# Altium footprint library ICs_rus.PCBLIB: 103 footprints (part 1 of 7)
Each footprint in its own frame and in the unit in brackets; x right, y up, seen from the top. Pads: shape width x height; smd on the part's side, far side on the other; paste and mask are expansions set on the pad; w line width, h text height; cw(c..) or ccw(c..) is an arc to the next point about the centre after c.
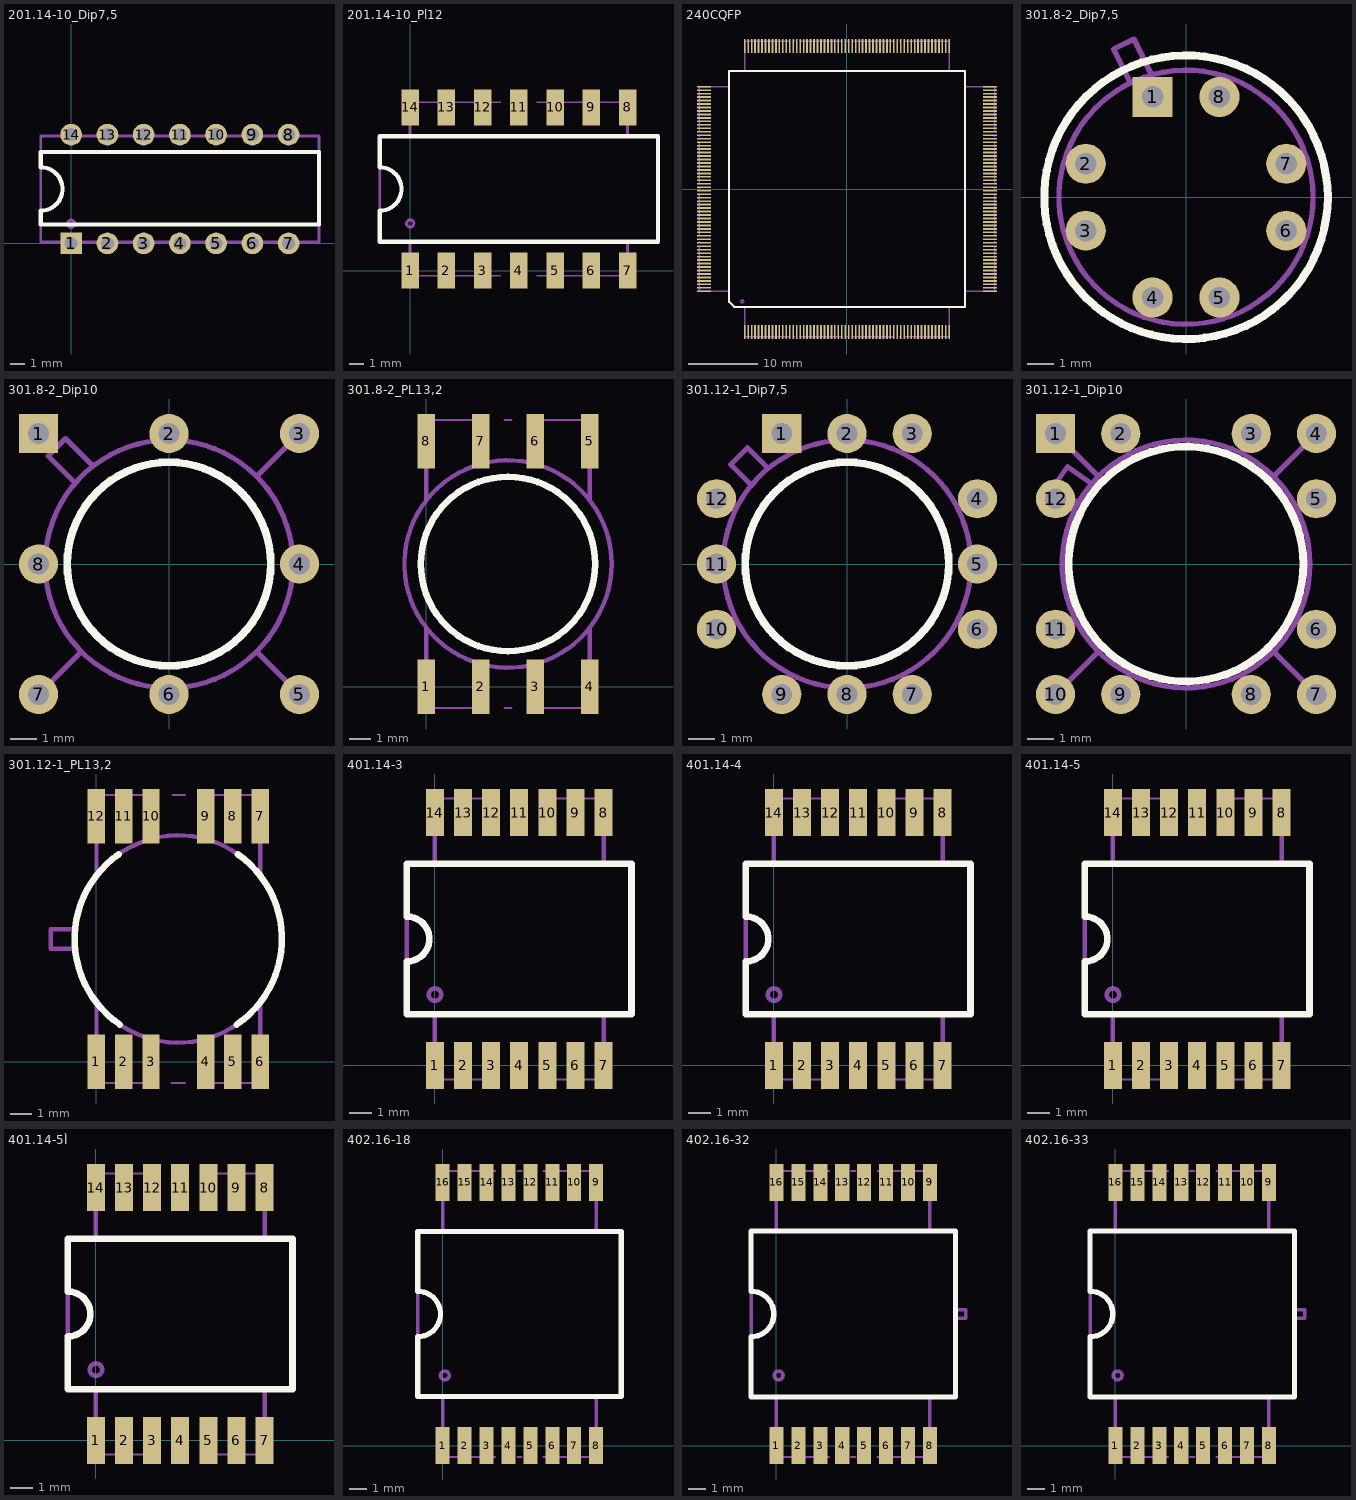
[diagram p0: the footprints below, top view; thin cyan lines are the x and y axes]

## 201.14-10_Dip7,5 [mm]
pads (14):
  rect 1.5x1.5 hole 0.9: 1(0,0)
  round 1.5 hole 0.9: 2(2.5,0) 3(5,0) 4(7.5,0) 5(10,0) 6(12.5,0) 7(15,0) 8(15,7.5) 9(12.5,7.5) 10(10,7.5) 11(7.5,7.5) 12(5,7.5) 13(2.5,7.5) 14(0,7.5)
Top Overlay:
  lines w0.3: -2.1,1.3 -2.1,2.25 ccw(c-2.1,3.75) -2.1,5.25 -2.1,6.3 17.1,6.3 17.1,1.3 -2.1,1.3
Mechanical 1:
  circle w0.2: c0,1.35 r0.251
  lines w0.2: -2.1,0.1 -2.1,7.4 17.1,7.4 17.1,0.1 -2.1,0.1
  text ".Comment" at 4.4,2.7 h1.5
  text ".Designator" at 6.3,4.8 h1.5
  text "14" at -0.5,5.5 h1.5
3D body: height 4.5, standoff -3, extent -2.2,-0.1 17,7.7

## 201.14-10_Pl12 [mm]
pads (14):
  rect 1.2x2.5 smd: 1(0,0) 2(2.5,0) 3(5,0) 4(7.5,0) 5(10,0) 6(12.5,0) 7(15,0) 8(15,11.25) 9(12.5,11.25) 10(10,11.25) 11(7.5,11.25) 12(5,11.25) 13(2.5,11.25) 14(0,11.25)
Top Overlay:
  lines w0.3: -2.1,1.975 -2.1,4.125 ccw(c-2.1,5.625) -2.1,7.125 -2.1,9.275 17.1,9.275 17.1,1.975 -2.1,1.975
Mechanical 1:
  circle w0.2: c0,3.25 r0.251
  lines w0.1: 0,-0.375 6.25,-0.375 ; 0,11.625 6.25,11.625 ; 7,-0.375 8,-0.375 ; 7,11.625 8,11.625 ; 8.75,-0.375 15,-0.375 ; 8.75,11.625 15,11.625
  lines w0.2: 0,-0.375 0,1.975 ; 0,9.275 0,11.625 ; 15,-0.375 15,1.975 ; 15,9.275 15,11.625 ; -2.1,1.975 -2.1,9.275 17.1,9.275 17.1,1.975 -2.1,1.975
  text "14" at 0.7,10.1 h1.5
  text ".Comment" at 4.5,4.3 h1.5
  text ".Designator" at 6.4,6.4 h1.5
3D body: height 4.5, standoff 0, extent -2.3,-0.4 16.9,11.6

## 240CQFP [mm]
pads (240):
  rect 0.25x2 smd: 1(-14.75,-20.625) 2(-14.25,-20.625) 3(-13.75,-20.625) 4(-13.25,-20.625) 5(-12.75,-20.625) 6(-12.25,-20.625) 7(-11.75,-20.625) 8(-11.25,-20.625) 9(-10.75,-20.625) 10(-10.25,-20.625) 11(-9.75,-20.625) 12(-9.25,-20.625) 13(-8.75,-20.625) 14(-8.25,-20.625) 15(-7.75,-20.625) 16(-7.25,-20.625) 17(-6.75,-20.625) 18(-6.25,-20.625) 19(-5.75,-20.625) 20(-5.25,-20.625) 21(-4.75,-20.625) 22(-4.25,-20.625) 23(-3.75,-20.625) 24(-3.25,-20.625) 25(-2.75,-20.625) 26(-2.25,-20.625) 27(-1.75,-20.625) 28(-1.25,-20.625) 29(-0.75,-20.625) 30(-0.25,-20.625) 31(0.25,-20.625) 32(0.75,-20.625) 33(1.25,-20.625) 34(1.75,-20.625) 35(2.25,-20.625) 36(2.75,-20.625) 37(3.25,-20.625) 38(3.75,-20.625) 39(4.25,-20.625) 40(4.75,-20.625) 41(5.25,-20.625) 42(5.75,-20.625) 43(6.25,-20.625) 44(6.75,-20.625) 45(7.25,-20.625) 46(7.75,-20.625) 47(8.25,-20.625) 48(8.75,-20.625) 49(9.25,-20.625) 50(9.75,-20.625) 51(10.25,-20.625) 52(10.75,-20.625) 53(11.25,-20.625) 54(11.75,-20.625) 55(12.25,-20.625) 56(12.75,-20.625) 57(13.25,-20.625) 58(13.75,-20.625) 59(14.25,-20.625) 60(14.75,-20.625) 121(14.75,20.625) 122(14.25,20.625) 123(13.75,20.625) 124(13.25,20.625) 125(12.75,20.625) 126(12.25,20.625) 127(11.75,20.625) 128(11.25,20.625) 129(10.75,20.625) 130(10.25,20.625) 131(9.75,20.625) 132(9.25,20.625) 133(8.75,20.625) 134(8.25,20.625) 135(7.75,20.625) 136(7.25,20.625) 137(6.75,20.625) 138(6.25,20.625) 139(5.75,20.625) 140(5.25,20.625) 141(4.75,20.625) 142(4.25,20.625) 143(3.75,20.625) 144(3.25,20.625) 145(2.75,20.625) 146(2.25,20.625) 147(1.75,20.625) 148(1.25,20.625) 149(0.75,20.625) 150(0.25,20.625) 151(-0.25,20.625) 152(-0.75,20.625) 153(-1.25,20.625) 154(-1.75,20.625) 155(-2.25,20.625) 156(-2.75,20.625) 157(-3.25,20.625) 158(-3.75,20.625) 159(-4.25,20.625) 160(-4.75,20.625) 161(-5.25,20.625) 162(-5.75,20.625) 163(-6.25,20.625) 164(-6.75,20.625) 165(-7.25,20.625) 166(-7.75,20.625) 167(-8.25,20.625) 168(-8.75,20.625) 169(-9.25,20.625) 170(-9.75,20.625) 171(-10.25,20.625) 172(-10.75,20.625) 173(-11.25,20.625) 174(-11.75,20.625) 175(-12.25,20.625) 176(-12.75,20.625) 177(-13.25,20.625) 178(-13.75,20.625) 179(-14.25,20.625) 180(-14.75,20.625)
  rect 2x0.25 smd: 61(20.625,-14.75) 62(20.625,-14.25) 63(20.625,-13.75) 64(20.625,-13.25) 65(20.625,-12.75) 66(20.625,-12.25) 67(20.625,-11.75) 68(20.625,-11.25) 69(20.625,-10.75) 70(20.625,-10.25) 71(20.625,-9.75) 72(20.625,-9.25) 73(20.625,-8.75) 74(20.625,-8.25) 75(20.625,-7.75) 76(20.625,-7.25) 77(20.625,-6.75) 78(20.625,-6.25) 79(20.625,-5.75) 80(20.625,-5.25) 81(20.625,-4.75) 82(20.625,-4.25) 83(20.625,-3.75) 84(20.625,-3.25) 85(20.625,-2.75) 86(20.625,-2.25) 87(20.625,-1.75) 88(20.625,-1.25) 89(20.625,-0.75) 90(20.625,-0.25) 91(20.625,0.25) 92(20.625,0.75) 93(20.625,1.25) 94(20.625,1.75) 95(20.625,2.25) 96(20.625,2.75) 97(20.625,3.25) 98(20.625,3.75) 99(20.625,4.25) 100(20.625,4.75) 101(20.625,5.25) 102(20.625,5.75) 103(20.625,6.25) 104(20.625,6.75) 105(20.625,7.25) 106(20.625,7.75) 107(20.625,8.25) 108(20.625,8.75) 109(20.625,9.25) 110(20.625,9.75) 111(20.625,10.25) 112(20.625,10.75) 113(20.625,11.25) 114(20.625,11.75) 115(20.625,12.25) 116(20.625,12.75) 117(20.625,13.25) 118(20.625,13.75) 119(20.625,14.25) 120(20.625,14.75) 181(-20.625,14.75) 182(-20.625,14.25) 183(-20.625,13.75) 184(-20.625,13.25) 185(-20.625,12.75) 186(-20.625,12.25) 187(-20.625,11.75) 188(-20.625,11.25) 189(-20.625,10.75) 190(-20.625,10.25) 191(-20.625,9.75) 192(-20.625,9.25) 193(-20.625,8.75) 194(-20.625,8.25) 195(-20.625,7.75) 196(-20.625,7.25) 197(-20.625,6.75) 198(-20.625,6.25) 199(-20.625,5.75) 200(-20.625,5.25) 201(-20.625,4.75) 202(-20.625,4.25) 203(-20.625,3.75) 204(-20.625,3.25) 205(-20.625,2.75) 206(-20.625,2.25) 207(-20.625,1.75) 208(-20.625,1.25) 209(-20.625,0.75) 210(-20.625,0.25) 211(-20.625,-0.25) 212(-20.625,-0.75) 213(-20.625,-1.25) 214(-20.625,-1.75) 215(-20.625,-2.25) 216(-20.625,-2.75) 217(-20.625,-3.25) 218(-20.625,-3.75) 219(-20.625,-4.25) 220(-20.625,-4.75) 221(-20.625,-5.25) 222(-20.625,-5.75) 223(-20.625,-6.25) 224(-20.625,-6.75) 225(-20.625,-7.25) 226(-20.625,-7.75) 227(-20.625,-8.25) 228(-20.625,-8.75) 229(-20.625,-9.25) 230(-20.625,-9.75) 231(-20.625,-10.25) 232(-20.625,-10.75) 233(-20.625,-11.25) 234(-20.625,-11.75) 235(-20.625,-12.25) 236(-20.625,-12.75) 237(-20.625,-13.25) 238(-20.625,-13.75) 239(-20.625,-14.25) 240(-20.625,-14.75)
Top Overlay:
  lines w0.3: -17,-16.25 -16.25,-17 17,-17 17,17 -17,17 -17,-16.25
Mechanical 1:
  lines w0.2: -21.31,-14.755 -21.301,-8.3 ; -21.301,8.3 -21.31,14.755 -17,14.75 ; -21.3,-7.6 -21.3,-7.5 ; -21.3,-6.8 -21.3,-0.7 ; -21.3,-0.1 -21.3,0.1 ; -21.3,0.7 -21.3,6.8 ; -21.3,7.5 -21.3,7.6 ; -21.25,-14.75 -17,-14.75 ; -14.755,-21.31 -8.3,-21.301 ; -14.755,17 -14.755,21.31 -8.3,21.301 ; -14.75,-21.31 -14.75,-17 ; -7.6,-21.3 -7.5,-21.3 ; -7.6,21.3 -7.5,21.3 ; -6.8,-21.3 -0.7,-21.3 ; -6.8,21.3 -0.7,21.3 ; -0.1,-21.3 0.1,-21.3 ; -0.1,21.3 0.1,21.3 ; 0.7,-21.3 6.8,-21.3 ; 0.7,21.3 6.8,21.3 ; 7.5,-21.3 7.6,-21.3 ; 7.5,21.3 7.6,21.3 ; 8.3,-21.301 14.755,-21.31 ; 8.3,21.301 14.755,21.31 ; 14.75,-21.31 14.75,-17 ; 14.75,17 14.75,21.31 ; 17,-14.75 21.31,-14.755 21.301,-8.3 ; 17,14.75 21.31,14.745 ; 21.3,-7.6 21.3,-7.5 ; 21.3,-6.8 21.3,-0.7 ; 21.3,-0.1 21.3,0.1 ; 21.3,0.7 21.3,6.8 ; 21.3,7.5 21.3,7.6 ; 21.301,8.3 21.31,14.755 ; -17,-16.25 -16.25,-17 17,-17 17,17 -17,17 -17,-16.25 ; -14.9,-16.2 ccw(c-15.1,-16.2) -14.9,-16.2
  text ".Designator" at -1.43,0.905 h1.5
  text ".Comment" at -3.02,-0.795 h1.5
  text "240" at -16.3,-14.7 h1.5

## 301.8-2_Dip7,5 [mm]
pads (8):
  rect 1.5x1.5 hole 0.8 unplated: 1(-1.25,3.75)
  round 1.5 hole 0.8 unplated: 2(-3.75,1.25) 3(-3.75,-1.25) 4(-1.25,-3.75) 5(1.25,-3.75) 6(3.75,-1.25) 7(3.75,1.25) 8(1.25,3.75)
Top Overlay:
  circle w0.3: c0,0 r5.3
Mechanical 1:
  circle w0.2: c0,0 r4.75
  lines w0.2: -2.08,4.275 -2.705,5.54 -1.945,5.915 -1.29,4.57
  text ".Designator" at -1,0 h1.5
  text ".Comment" at -2.9,-2.1 h1.5
  text "8" at 1,2.9 h1.5
3D body: height 8.5, standoff -3, extent -4.7,-4.7 4.69,5.185

## 301.8-2_Dip10 [mm]
pads (8):
  rect 1.5x1.5 hole 0.8 unplated: 1(-5,5)
  round 1.5 hole 0.8 unplated: 2(0,5) 3(5,5) 4(5,0) 5(5,-5) 6(0,-5) 7(-5,-5) 8(-5,0)
Top Layer:
  lines w0.2: -5,5 -4.4,4.4 -5,5
Top Overlay:
  circle w0.3: c0,0 r3.9
Mechanical 1:
  circle w0.2: c0,0 r4.75
  lines w0.2: -5,-5 -3.375,-3.375 ; -5,0 -4.75,0 ; -5,5 -4.4,4.4 ; -3.595,3.1 -4.63,4.145 -3.97,4.805 -2.91,3.755 ; 0,-5 0,-4.75 ; 0,4.75 0,5 ; 3.375,-3.375 5,-5 ; 3.375,3.375 5,5 ; 4.75,0 5,0
  text ".Comment" at -2.7,-1.4 h1.5
  text ".Designator" at -0.8,0.7 h1.5
  text "8" at -3.7,-0.3 h1.5
3D body: height 8.5, standoff -3, extent -5.2,-5.3 5.3,5.2

## 301.8-2_PL13,2 [mm]
pads (8):
  rect 0.8x2.5 smd: 1(0,0) 2(2.5,0) 3(5,0) 4(7.5,0) 5(7.5,11.25) 6(5,11.25) 7(2.5,11.25) 8(0,11.25)
Top Overlay:
  circle w0.3: c3.75,5.625 r4
Mechanical 1:
  circle w0.2: c3.75,5.625 r4.75
  lines w0.1: 0,-0.975 2.5,-0.975 ; 0,12.225 2.5,12.225 ; 3.6,-0.975 3.9,-0.975 ; 3.6,12.225 3.9,12.225 ; 5,-0.975 7.5,-0.975 ; 5,12.225 7.5,12.225
  lines w0.2: 0,-0.975 0,2.7 ; 0,8.55 0,12.225 ; 7.5,-0.975 7.5,2.7 ; 7.5,8.55 7.5,12.225
  text "1" at 0.7,-0.5 h1.5
  text "8" at 0.6,10.7 h1.5
  text ".Comment" at 1,4 h1.5
  text ".Designator" at 2.9,6.1 h1.5
3D body: height 7.3, standoff 0, extent -1.3,-1 8.382,12.2

## 301.12-1_Dip7,5 [mm]
pads (12):
  rect 1.5x1.5 hole 0.8 unplated: 1(-2.5,5)
  round 1.5 hole 0.8 unplated: 2(0,5) 3(2.5,5) 4(5,2.5) 5(5,0) 6(5,-2.5) 7(2.5,-5) 8(0,-5) 9(-2.5,-5) 10(-5,-2.5) 11(-5,0) 12(-5,2.5)
Top Overlay:
  circle w0.3: c0,0 r3.9
Mechanical 1:
  circle w0.2: c0,0 r4.75
  lines w0.2: -3.677,3.041 -4.455,3.818 -3.818,4.455 -3.041,3.677
  text ".Designator" at -0.8,0.6 h1.5
  text ".Comment" at -2.7,-1.5 h1.5
  text "12" at -4.224,0.243 h1.5
3D body: height 8.5, standoff -3, extent -5.3,-5.3 5.28,5.28

## 301.12-1_Dip10 [mm]
pads (12):
  rect 1.5x1.5 hole 0.8 unplated: 1(-5,5)
  round 1.5 hole 0.8 unplated: 2(-2.5,5) 3(2.5,5) 4(5,5) 5(5,2.5) 6(5,-2.5) 7(5,-5) 8(2.5,-5) 9(-2.5,-5) 10(-5,-5) 11(-5,-2.5) 12(-5,2.5)
Top Layer:
  lines w0.2: -5,5 -4.4,4.4 -5,5
Top Overlay:
  circle w0.3: c0,0 r4.5
Mechanical 1:
  circle w0.2: c0,0 r4.75
  lines w0.2: -5,-5 -3.375,-3.375 ; -5,-2.5 -4.25,-2.15 ; -5,2.5 -4.25,2.15 ; -5,5 -3.35,3.35 ; -4.159,2.364 -5.06,2.995 -4.543,3.732 -3.642,3.101 ; -2.5,-5 -2.15,-4.25 ; -2.5,5 -2.15,4.25 ; 2.15,-4.25 2.5,-5 ; 2.15,4.25 2.5,5 ; 3.375,-3.375 5,-5 ; 3.375,3.375 5,5 ; 4.25,-2.15 5,-2.5 ; 4.25,2.15 5,2.5
  text "12" at -3.8,0.8 h1.5
  text ".Comment" at -3,-1.3 h1.5
  text ".Designator" at -1.1,0.8 h1.5
3D body: height 8.5, standoff -3, extent -5.3,-5.3 5.205,5.205

## 301.12-1_PL13,2 [mm]
pads (12):
  rect 0.8x2.5 smd: 1(0,0) 2(1.25,0) 3(2.5,0) 4(5,0) 5(6.25,0) 6(7.5,0) 7(7.5,11.25) 8(6.25,11.25) 9(5,11.25) 10(2.5,11.25) 11(1.25,11.25) 12(0,11.25)
Top Overlay:
  lines w0.3: 1.021,9.513 ccw(c3.75,5.625) 1.07,1.703 ; 6.43,1.703 ccw(c3.75,5.625) 6.479,9.513
Mechanical 1:
  circle w0.2: c3.75,5.625 r4.75
  lines w0.1: 0,-0.975 2.85,-0.975 ; 0,12.225 2.85,12.225 ; 3.45,-0.975 4.05,-0.975 ; 3.5,12.225 4.05,12.225 ; 4.65,-0.975 7.5,-0.975 ; 4.65,12.225 7.5,12.225
  lines w0.2: -1,5.175 -2.1,5.175 -2.1,6.075 -1,6.075 ; 0,-0.975 0,2.7 ; 0,8.55 0,12.225 ; 7.5,-0.975 7.5,2.7 ; 7.5,8.55 7.5,12.225
  text ".Designator" at 2.7,6.2 h1.5
  text ".Comment" at 0.8,4.1 h1.5
  text "12" at 0.6,10.8 h1.5
  text "1" at 0.022,-1.257 h1.5
3D body: height 7.3, standoff 0, extent -1.5,-1 8.468,12.2

## 401.14-3 [mm]
height 2.3
pads (14):
  rect 0.8x2.1 smd: 1(0,0) 2(1.25,0) 3(2.5,0) 4(3.75,0) 5(5,0) 6(6.25,0) 7(7.5,0) 8(7.5,11.25) 9(6.25,11.25) 10(5,11.25) 11(3.75,11.25) 12(2.5,11.25) 13(1.25,11.25) 14(0,11.25)
Top Overlay:
  lines w0.3: -1.25,2.275 -1.25,4.625 ccw(c-1.25,5.625) -1.25,6.625 -1.25,8.975 8.75,8.975 8.75,2.275 -1.25,2.275
Mechanical 1:
  circle w0.2: c0,3.15 r0.275
  lines w0.1: 0,-0.625 2.75,-0.625 ; 0,11.875 2.75,11.875 ; 3.625,-0.625 3.875,-0.625 ; 3.625,11.875 3.875,11.875 ; 4.75,-0.625 7.5,-0.625 ; 4.75,11.875 7.5,11.875
  lines w0.2: 0,-0.625 0,2.275 ; 0,8.975 0,11.875 ; 7.5,-0.625 7.5,2.275 ; 7.5,8.975 7.5,11.875 ; -1.25,2.275 -1.25,8.975 8.75,8.975 8.75,2.275 -1.25,2.275
  text "14" at 0.6,10.3 h1.5
  text ".Comment" at 0.8,4.2 h1.5
  text ".Designator" at 2.7,6.3 h1.5
3D body: height 1.97, standoff 0, extent -1.2,-0.6 8.8,11.9

## 401.14-4 [mm]
height 2.3
pads (14):
  rect 0.8x2.1 smd: 1(0,0) 2(1.25,0) 3(2.5,0) 4(3.75,0) 5(5,0) 6(6.25,0) 7(7.5,0) 8(7.5,11.25) 9(6.25,11.25) 10(5,11.25) 11(3.75,11.25) 12(2.5,11.25) 13(1.25,11.25) 14(0,11.25)
Top Overlay:
  lines w0.3: -1.25,2.275 -1.25,4.625 ccw(c-1.25,5.625) -1.25,6.625 -1.25,8.975 8.75,8.975 8.75,2.275 -1.25,2.275
Mechanical 1:
  circle w0.2: c0,3.15 r0.275
  lines w0.1: 0,-0.625 2.75,-0.625 ; 0,11.875 2.75,11.875 ; 3.625,-0.625 3.875,-0.625 ; 3.625,11.875 3.875,11.875 ; 4.75,-0.625 7.5,-0.625 ; 4.75,11.875 7.5,11.875
  lines w0.2: 0,-0.625 0,2.275 ; 0,8.975 0,11.875 ; 7.5,-0.625 7.5,2.275 ; 7.5,8.975 7.5,11.875 ; -1.25,2.275 -1.25,8.975 8.75,8.975 8.75,2.275 -1.25,2.275
  text "14" at 0.6,10.3 h1.5
  text ".Comment" at 0.8,4.2 h1.5
  text ".Designator" at 2.7,6.3 h1.5
3D body: height 1.97, standoff 0, extent -1.2,-0.6 8.8,11.9

## 401.14-5 [mm]
height 2.3
pads (14):
  rect 0.8x2.1 smd: 1(0,0) 2(1.25,0) 3(2.5,0) 4(3.75,0) 5(5,0) 6(6.25,0) 7(7.5,0) 8(7.5,11.25) 9(6.25,11.25) 10(5,11.25) 11(3.75,11.25) 12(2.5,11.25) 13(1.25,11.25) 14(0,11.25)
Top Overlay:
  lines w0.3: -1.25,2.275 8.75,2.275 8.75,8.975 -1.25,8.975 -1.25,6.625 cw(c-1.25,5.625) -1.25,4.625 -1.25,2.275
Mechanical 1:
  circle w0.2: c0,3.15 r0.275
  lines w0.1: 0,-0.625 2.75,-0.625 ; 0,11.875 2.75,11.875 ; 3.625,-0.625 3.875,-0.625 ; 3.625,11.875 3.875,11.875 ; 4.75,-0.625 7.5,-0.625 ; 4.75,11.875 7.5,11.875
  lines w0.2: 0,-0.625 0,2.275 ; 0,8.975 0,11.875 ; 7.5,-0.625 7.5,2.275 ; 7.5,8.975 7.5,11.875 ; -1.25,2.275 8.75,2.275 8.75,8.975 -1.25,8.975 -1.25,2.275
  text ".Designator" at 2.7,6.3 h1.5
  text ".Comment" at 0.8,4.2 h1.5
  text "14" at 0.6,10.3 h1.5
3D body: height 1.97, standoff 0, extent -1.2,-0.6 8.8,11.9

## 401.14-5Ì [mm]
height 2.3
pads (14):
  rect 0.8x2.1 smd: 1(0,0) 2(1.25,0) 3(2.5,0) 4(3.75,0) 5(5,0) 6(6.25,0) 7(7.5,0) 8(7.5,11.25) 9(6.25,11.25) 10(5,11.25) 11(3.75,11.25) 12(2.5,11.25) 13(1.25,11.25) 14(0,11.25)
Top Overlay:
  lines w0.3: -1.25,2.275 8.75,2.275 8.75,8.975 -1.25,8.975 -1.25,6.625 cw(c-1.25,5.625) -1.25,4.625 -1.25,2.275
Mechanical 1:
  circle w0.2: c0,3.15 r0.275
  lines w0.1: 0,-0.625 2.75,-0.625 ; 0,11.875 2.75,11.875 ; 3.625,-0.625 3.875,-0.625 ; 3.625,11.875 3.875,11.875 ; 4.75,-0.625 7.5,-0.625 ; 4.75,11.875 7.5,11.875
  lines w0.2: 0,-0.625 0,2.275 ; 0,8.975 0,11.875 ; 7.5,-0.625 7.5,2.275 ; 7.5,8.975 7.5,11.875 ; -1.25,2.275 8.75,2.275 8.75,8.975 -1.25,8.975 -1.25,2.275
  text ".Designator" at 2.7,6.3 h1.5
  text ".Comment" at 0.8,4.2 h1.5
  text "14" at 0.6,10.3 h1.5
3D body: height 1.97, standoff 0, extent -1.2,-0.6 8.8,11.9

## 402.16-18 [mm]
pads (16):
  rect 0.8x2.1 smd: 1(0,0) 2(1.25,0) 3(2.5,0) 4(3.75,0) 5(5,0) 6(6.25,0) 7(7.5,0) 8(8.75,0) 9(8.75,15) 10(7.5,15) 11(6.25,15) 12(5,15) 13(3.75,15) 14(2.5,15) 15(1.25,15) 16(0,15)
Top Overlay:
  lines w0.3: -1.425,2.8 10.175,2.8 10.175,12.2 -1.425,12.2 -1.425,8.8 cw(c-1.425,7.5) -1.425,6.2 -1.425,2.8
Mechanical 1:
  circle w0.2: c0.125,4 r0.25
  lines w0.1: 0,-0.65 3,-0.65 ; 0,15.65 3,15.65 ; 4.25,-0.65 4.5,-0.65 ; 4.25,15.65 4.5,15.65 ; 5.75,-0.65 8.75,-0.65 ; 5.75,15.65 8.75,15.65
  lines w0.2: 0,-0.65 0,2.75 ; 0,12.2 0,15.65 ; 8.75,-0.65 8.75,2.75 ; 8.75,12.2 8.75,15.65 ; 10.175,12.175 10.175,2.8 -1.425,2.8 -1.425,12.2 10.175,12.2
  text ".Designator" at 3.5,8.4 h1.5
  text ".Comment" at 1.6,6.3 h1.5
  text "16" at 0.8,13.7 h1.5
3D body: height 2.5, standoff 0, extent -1.5,-0.6 10.1,15.7

## 402.16-32 [mm]
pads (16):
  rect 0.8x2.1 smd: 1(0,0) 2(1.25,0) 3(2.5,0) 4(3.75,0) 5(5,0) 6(6.25,0) 7(7.5,0) 8(8.75,0) 9(8.75,15) 10(7.5,15) 11(6.25,15) 12(5,15) 13(3.75,15) 14(2.5,15) 15(1.25,15) 16(0,15)
Top Overlay:
  lines w0.3: -1.45,2.775 -1.45,6.2 ccw(c-1.45,7.5) -1.45,8.8 -1.45,12.225 10.2,12.225 10.2,2.775 -1.45,2.775
Mechanical 1:
  circle w0.2: c0.125,4 r0.25
  lines w0.1: 0,-0.65 3,-0.65 ; 0,15.65 3,15.65 ; 4.25,-0.65 4.5,-0.65 ; 4.25,15.65 4.5,15.65 ; 5.75,-0.65 8.75,-0.65 ; 5.75,15.65 8.75,15.65
  lines w0.2: 0,-0.65 0,2.775 ; 0,12.225 0,15.65 ; 8.75,-0.65 8.75,2.775 ; 8.75,12.225 8.75,15.65 ; 10.19,7.245 10.79,7.245 10.79,7.745 10.19,7.745 ; -1.45,2.775 -1.45,12.225 10.2,12.225 10.2,2.775 -1.45,2.775
  text ".Designator" at 3.8,8.2 h1.5
  text ".Comment" at 1.9,6.1 h1.5
  text "16" at 0.8,13.8 h1.5
3D body: height 2.5, standoff 0, extent -1.5,-0.6 10.75,15.7

## 402.16-33 [mm]
pads (16):
  rect 0.8x2.1 smd: 1(0,0) 2(1.25,0) 3(2.5,0) 4(3.75,0) 5(5,0) 6(6.25,0) 7(7.5,0) 8(8.75,0) 9(8.75,15) 10(7.5,15) 11(6.25,15) 12(5,15) 13(3.75,15) 14(2.5,15) 15(1.25,15) 16(0,15)
Top Overlay:
  lines w0.3: -1.45,2.775 10.2,2.775 10.2,12.225 -1.45,12.225 -1.45,8.8 cw(c-1.45,7.5) -1.45,6.2 -1.45,2.775
Mechanical 1:
  circle w0.2: c0.125,4 r0.25
  lines w0.1: 0,-0.65 3,-0.65 ; 0,15.65 3,15.65 ; 4.25,-0.65 4.5,-0.65 ; 4.25,15.65 4.5,15.65 ; 5.75,-0.65 8.75,-0.65 ; 5.75,15.65 8.75,15.65
  lines w0.2: 0,-0.65 0,2.775 ; 0,12.225 0,15.65 ; 8.75,-0.65 8.75,2.775 ; 8.75,12.225 8.75,15.65 ; 10.19,7.245 10.79,7.245 10.79,7.745 10.19,7.745 ; -1.45,2.775 10.2,2.775 10.2,12.225 -1.45,12.225 -1.45,2.775
  text "16" at 0.7,13.6 h1.5
  text ".Comment" at 1.7,5.9 h1.5
  text ".Designator" at 3.6,8 h1.5
3D body: height 2.5, standoff 0, extent -1.5,-0.6 10.75,15.7